# Altium footprint library fszhang.PcbLib: 1032 footprints (part 5 of 66)
Each footprint in its own frame and in the unit in brackets; x right, y up, seen from the top. Pads: shape width x height; smd on the part's side, far side on the other; paste and mask are expansions set on the pad; w line width, h text height; cw(c..) or ccw(c..) is an arc to the next point about the centre after c.
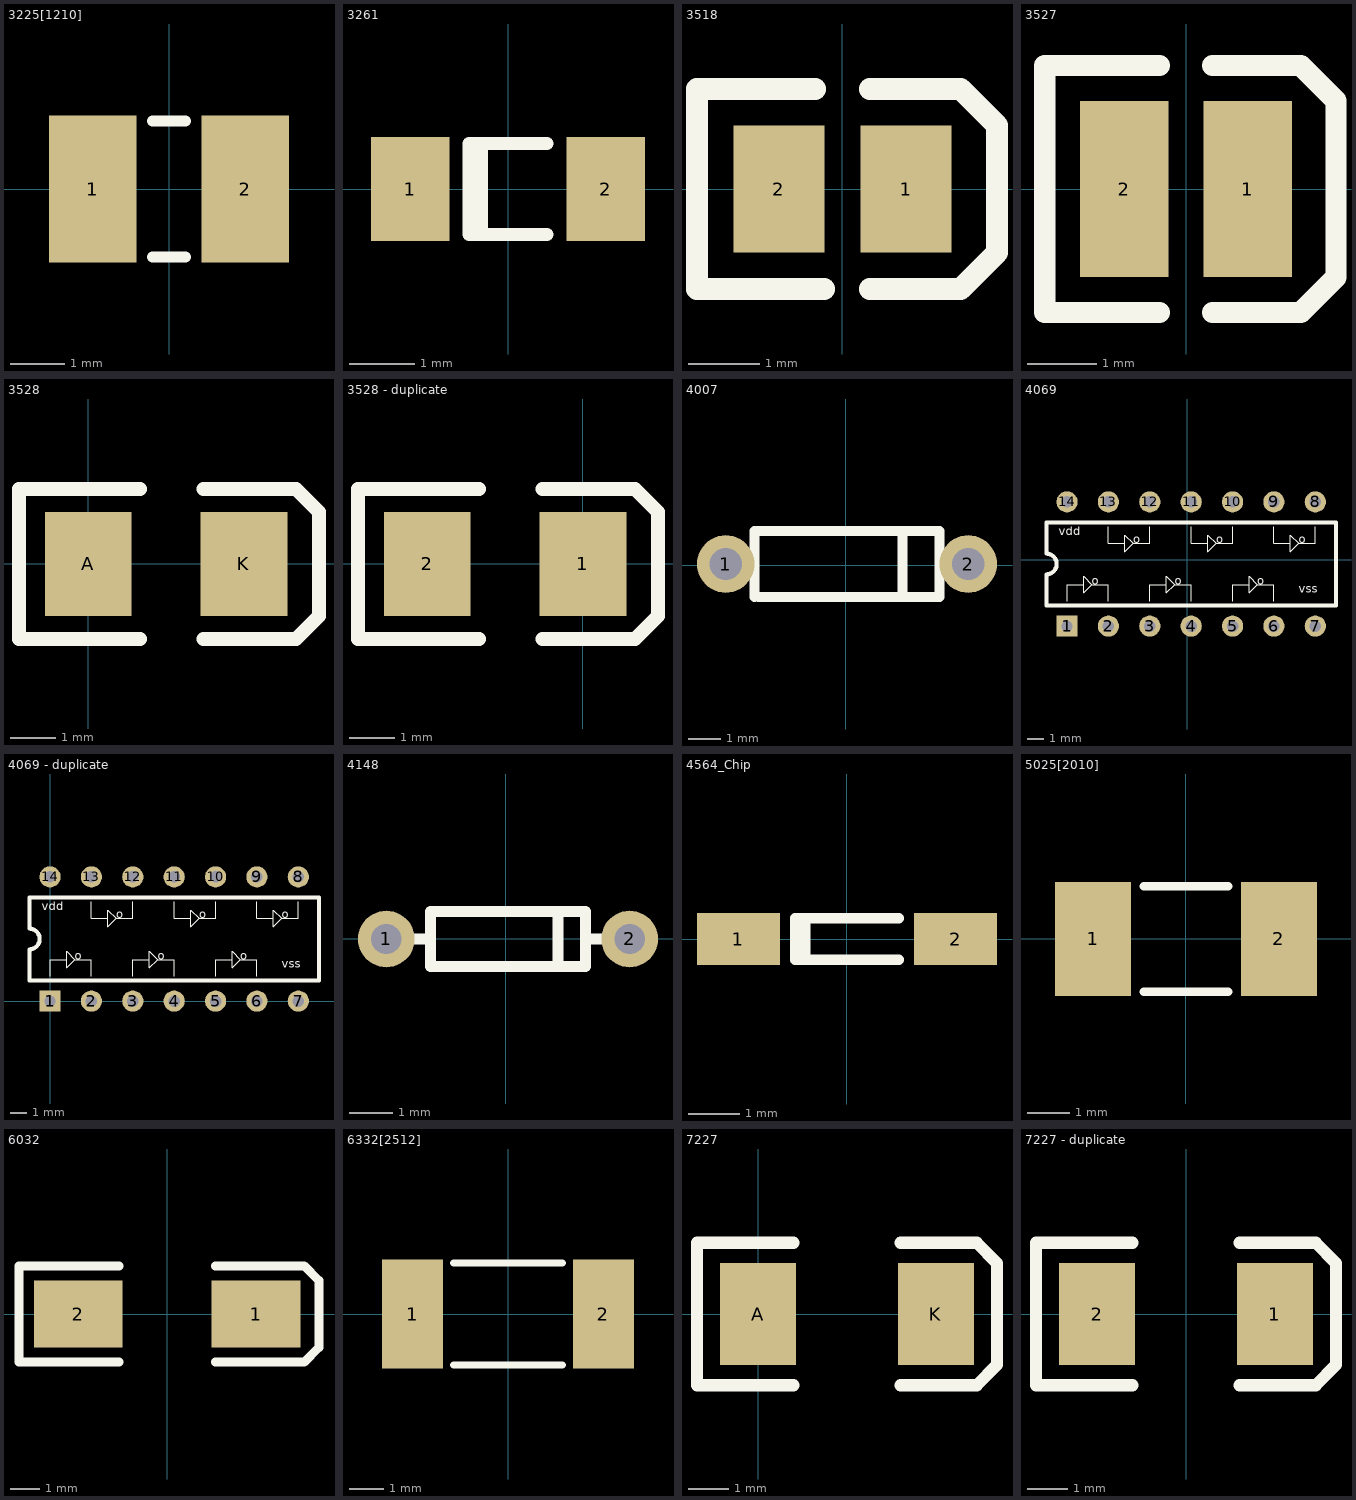
[diagram p4: the footprints below, top view; thin cyan lines are the x and y axes]

## 3225[1210] [mm] "Chip Resistor; Body 3.2 x 2.5 mm (LxW typ)"
height 0.6
pads (2):
  rect 1.6x2.7 smd: 1(-1.4,0) 2(1.4,0)
Top Overlay:
  lines w0.2: -0.3,-1.25 0.3,-1.25 ; -0.3,1.25 0.3,1.25

## 3261 [mm] "3216 Chip; Chip Inductor; Body 3.2 x 1.6 mm (LxW typ)"
height 0.55
pads (2):
  rect 1.2x1.6 smd: 1(-1.5,0) 2(1.5,0)
Top Overlay:
  lines w0.2: -0.41,-0.7 -0.41,0.7 ; 0.6,-0.7 -0.6,-0.7 -0.6,0.7 0.6,0.7

## 3518 [mil]
pads (2):
  rect 50x70 smd: 1(35,0) 2(-35,0)
Top Overlay:
  lines w12: -15,55 -80,55 -80,-55 -10,-55 ; 15,-55 65,-55 85,-35 85,35 65,55 15,55

## 3527 [mil]
pads (2):
  rect 50x100 smd: 1(35,0) 2(-35,0)
Top Overlay:
  lines w12: -15,-70 -80,-70 -80,70 -15,70 ; 15,-70 65,-70 85,-50 85,50 65,70 15,70

## 3528 [mil]
pads (2):
  rect 75x90 smd: A(0,0) K(135,0)
Top Overlay:
  lines w12: 45,-65 -60,-65 -60,65 45,65 ; 100,-65 180,-65 200,-45 200,45 180,65 100,65

## 3528 - duplicate [mil]
pads (2):
  rect 75x90 smd: 1(0,0) 2(-135,0)
Top Overlay:
  lines w12: -90,-65 -195,-65 -195,65 -90,65 ; -35,-65 45,-65 65,-45 65,45 45,65 -35,65

## 4007 [mil]
pads (2):
  round 70 hole 39.37: 1(-145.75,1.42) 2(149.25,1.42)
Top Overlay:
  lines w12: -110.75,-38.58 -110.75,41.42 114.25,41.42 114.25,-38.58 -105.75,-38.58 ; 69.25,-38.58 69.25,41.42

## 4069 [mm]
pads (14):
  rect 1.3x1.3 hole 0.7: 1(-7.366,-4.064)
  round 1.3 hole 0.7: 2(-4.826,-4.064) 3(-2.286,-4.064) 4(0.254,-4.064) 5(2.794,-4.064) 6(5.334,-4.064) 7(7.874,-4.064) 8(7.874,3.556) 9(5.334,3.556) 10(2.794,3.556) 11(0.254,3.556) 12(-2.286,3.556) 13(-4.826,3.556) 14(-7.366,3.556)
Top Overlay:
  lines w0.051: -7.366,-2.54 -7.366,-1.524 -6.858,-1.524 -6.35,-1.524 ; -4.826,-2.54 -4.826,-1.524 -5.842,-1.524 ; -4.826,2.032 -4.826,1.016 -4.318,1.016 -3.81,1.016 ; -2.286,-2.54 -2.286,-1.524 -1.778,-1.524 -1.27,-1.524 ; -2.286,2.032 -2.286,1.016 -3.302,1.016 ; 0.254,-2.54 0.254,-1.524 -0.762,-1.524 ; 0.254,2.032 0.254,1.016 0.762,1.016 1.27,1.016 ; 2.794,-2.54 2.794,-1.524 3.302,-1.524 3.81,-1.524 ; 2.794,2.032 2.794,1.016 1.778,1.016 ; 5.334,-2.54 5.334,-1.524 4.318,-1.524 ; 5.334,2.032 5.334,1.016 5.842,1.016 6.35,1.016 ; 7.874,2.032 7.874,1.016 6.858,1.016 ; -5.842,-1.524 -6.35,-2.032 -6.35,-1.016 -5.842,-1.524 ; -3.302,1.016 -3.81,0.508 -3.81,1.524 -3.302,1.016 ; -0.762,-1.524 -1.27,-2.032 -1.27,-1.016 -0.762,-1.524 ; 1.778,1.016 1.27,0.508 1.27,1.524 1.778,1.016 ; 4.318,-1.524 3.81,-2.032 3.81,-1.016 4.318,-1.524 ; 6.858,1.016 6.35,0.508 6.35,1.524 6.858,1.016
  lines w0.254: -8.636,-2.794 9.144,-2.794 9.144,2.286 -8.636,2.286 -8.636,0.381 cw(c-8.636,-0.254) -8.636,-0.889 -8.636,-2.794
  text "vss" at 6.858,-2.032 h0.51
  text "vdd" at -7.874,1.524 h0.51
  text "o" at -3.302,1.016 h0.51
  text "o" at 1.778,1.016 h0.51
  text "o" at 6.858,1.016 h0.51
  text "o" at 4.318,-1.524 h0.51
  text "o" at -0.762,-1.524 h0.51
  text "o" at -5.842,-1.524 h0.51

## 4069 - duplicate [mm]
pads (14):
  rect 1.3x1.3 hole 0.7: 1(0,0)
  round 1.3 hole 0.7: 2(2.54,0) 3(5.08,0) 4(7.62,0) 5(10.16,0) 6(12.7,0) 7(15.24,0) 8(15.24,7.62) 9(12.7,7.62) 10(10.16,7.62) 11(7.62,7.62) 12(5.08,7.62) 13(2.54,7.62) 14(0,7.62)
Top Overlay:
  lines w0.051: 0,1.524 0,2.54 0.508,2.54 1.016,2.54 ; 2.54,1.524 2.54,2.54 1.524,2.54 ; 2.54,6.096 2.54,5.08 3.048,5.08 3.556,5.08 ; 5.08,1.524 5.08,2.54 5.588,2.54 6.096,2.54 ; 5.08,6.096 5.08,5.08 4.064,5.08 ; 7.62,1.524 7.62,2.54 6.604,2.54 ; 7.62,6.096 7.62,5.08 8.128,5.08 8.636,5.08 ; 10.16,1.524 10.16,2.54 10.668,2.54 11.176,2.54 ; 10.16,6.096 10.16,5.08 9.144,5.08 ; 12.7,1.524 12.7,2.54 11.684,2.54 ; 12.7,6.096 12.7,5.08 13.208,5.08 13.716,5.08 ; 15.24,6.096 15.24,5.08 14.224,5.08 ; 1.524,2.54 1.016,3.048 1.016,2.032 1.524,2.54 ; 4.064,5.08 3.556,5.588 3.556,4.572 4.064,5.08 ; 6.604,2.54 6.096,3.048 6.096,2.032 6.604,2.54 ; 9.144,5.08 8.636,5.588 8.636,4.572 9.144,5.08 ; 11.684,2.54 11.176,3.048 11.176,2.032 11.684,2.54 ; 14.224,5.08 13.716,5.588 13.716,4.572 14.224,5.08
  lines w0.254: -1.27,1.27 -1.27,3.175 ccw(c-1.27,3.81) -1.27,4.445 -1.27,6.35 16.51,6.35 16.51,1.27 -1.27,1.27
  text "o" at 1.524,2.54 h0.51
  text "o" at 6.604,2.54 h0.51
  text "o" at 11.684,2.54 h0.51
  text "o" at 14.224,5.08 h0.51
  text "o" at 9.144,5.08 h0.51
  text "o" at 4.064,5.08 h0.51
  text "vdd" at -0.508,5.588 h0.51
  text "vss" at 14.224,2.032 h0.51

## 4148 [mm]
pads (2):
  round 1.3 hole 0.7: 1(-2.746,0) 2(2.842,0)
Top Overlay:
  lines w0.254: -2.111,0 -1.73,0 ; 1.191,0.508 1.191,-0.635 1.191,0.635 ; 1.826,0 2.334,0 ; -1.73,-0.635 1.826,-0.635 1.826,0.635 -1.73,0.635 -1.73,-0.635

## 4564_Chip [mm] "4564 Chip; Chip Inductor; Body 4.5 x 6.4 mm (LxW typ)"
height 0.55
pads (2):
  rect 1.6x1 smd: 1(-2.1,0) 2(2.1,0)
Top Overlay:
  lines w0.2: -0.81,-0.4 -0.81,0.4 ; 1,-0.4 -1,-0.4 -1,0.4 1,0.4

## 5025[2010] [mm] "Chip Resistor; Body 5.0 x 2.5 mm (LxW typ)"
height 0.6
pads (2):
  rect 1.8x2.7 smd: 1(-2.2,0) 2(2.2,0)
Top Overlay:
  lines w0.2: -1,-1.25 1,-1.25 ; -1,1.25 1,1.25

## 6032 [mil]
pads (2):
  rect 120x90 smd: 1(120,0) 2(-120,0)
Top Overlay:
  lines w12: -65,-65 -200,-65 -200,65 -65,65 ; 65,-65 185,-65 205,-45 205,45 185,65 65,65

## 6332[2512] [mm] "Chip Resistor; Body 6.3 x 3.2 mm (LxW typ)"
height 0.6
pads (2):
  rect 1.8x3.2 smd: 1(-2.8,0) 2(2.8,0)
Top Overlay:
  lines w0.2: -1.6,-1.5 1.6,-1.5 ; -1.6,1.5 1.6,1.5

## 7227 [mil]
pads (2):
  rect 75x100 smd: A(0,0) K(175,0)
Top Overlay:
  lines w12: 35,-70 -60,-70 -60,70 35,70 ; 140,-70 215,-70 235,-50 235,50 215,70 140,70

## 7227 - duplicate [mil]
pads (2):
  rect 75x100 smd: 1(87.5,0) 2(-87.5,0)
Top Overlay:
  lines w12: -52.5,-70 -147.5,-70 -147.5,70 -52.5,70 ; 52.5,-70 127.5,-70 147.5,-50 147.5,50 127.5,70 52.5,70